# Altium integrated library Integrated_Library - 02.02.25 - 22.49.IntLib: 792 symbols (part 1 of 11) (continued)
## CMP-001-00032-8
designator C?, comment ECA-1HM471  value 470µF  Ripple Current: 650mA  Packaging: Bulk  Capacitor Type: Electrolytic  Diameter: 10mm  Case/Package: Radial  Tolerance: 20%  Max Operating Temperature: 85°C  Pins: 2  Min Operating Temperature: -40°C  RoHS Compliant: True  Mounting Technology: TH  Package Quantity: 200  Lead Pitch: 5mm  Manufacturer: Panasonic  Package Description: 2-Pin Radial Lead, Dia 10 mm, Height 22 mm  Datasheet Version: Mar-16  Package Reference: CAPPR65-500-2000X1000X2200  Voltage Rating: 50V
Aluminum Electrolytic Capacitor, 470 uF, +/- 20%, 50 V, -40 to 85 degC, 2-Pin THD, RoHS, Bulk; Ripple Current (AC): 650mA; Datasheet URL: http://industrial.panasonic.com/cdbs/www-data/pdf/RDF0000/ABA0000C1047.pdf; Manufacturer URL: http://www.panasonic.com/
footprint EEF-CX1E330R-Footprint-1
footprint CAPPR65-500-2000X1000X2200 (THD, 2-Leads, Dia 10mm, Pin Spacing 5mm)
pins: 1, 2

## CMP-001-00033-7
designator C?, comment ECA1HM4R7  value 4.7µF  Diameter: 5mm  Min Operating Temperature: -40°C  Ripple Current (AC): 45mA  Lead Pitch: 2mm  Package Quantity: 200  Capacitor Type: Electrolytic  Datasheet Version: Rev. 05, 10/2016  Case/Package: Radial  Pins: 2  RoHS Compliant: True  Package Description: 2-Pin Radial Lead, Dia 5 mm, Height 12 mm  Packaging: Bulk  Voltage Rating: 50V  Manufacturer: Panasonic  Mounting Technology: TH  Max Operating Temperature: 85°C  Package Reference: CAPPR55-200-1100X500X1200  Tolerance: 20%
Aluminum Electrolytic Capacitor, 4.7 uF, +/- 20%, 50 V, -40 to 85 degC, 2-Pin THD, RoHS, Bulk; Ripple Current: 45mA; Manufacturer URL: http://www.panasonic.com/; Datasheet URL: https://industrial.panasonic.com/cdbs/www-data/pdf/RDF0000/ABA0000C1218.pdf
footprint EEF-CX1E330R-Footprint-1
footprint CAPPR55-200-1100X500X1200 (THD, 2-Leads, Dia 5mm, Pin Spacing 2mm)
pins: 1, 2

## CMP-001-00034-7
designator C?, comment ECA-2AM101  value 100µF  Max Operating Temperature: 85°C  Package Quantity: 200  Package Description: 2-Pin Through Hole Device, Dia 10 mm, Body Length 16 mm  Package Reference: CAPPR65-500-1600X1000X1700  Pins: 2  Case/Package: Radial  Mounting Technology: TH  Packaging: Bulk  Min Operating Temperature: -40°C  Capacitor Type: Electrolytic  Datasheet Version: Mar-16  Ripple Current (AC): 350mA  RoHS Compliant: True  Manufacturer: Panasonic  Tolerance: 20%  Diameter: 10mm  Lead Pitch: 5mm  Voltage Rating: 100V
Aluminum Electrolytic Capacitor, 100 uF, +/- 20%, 100 V, -40 to 85 degC, 2-Pin THD, RoHS, Bulk; Datasheet URL: https://industrial.panasonic.com/cdbs/www-data/pdf/RDF0000/ABA0000C1047.pdf; Manufacturer URL: http://www.panasonic.com/; Ripple Current: 350mA
footprint EEF-CX1E330R-Footprint-1
footprint CAPPR65-500-1600X1000X1700 (THD, 2-Leads, Dia 10mm, Body Length 16mm)
pins: 1, 2

## CMP-001-00035-7
designator C?, comment ECA-2AM220  value 22µF  Voltage Rating: 100V  Packaging: Bulk  Package Description: 2-Pin Radial Lead, Dia 6.3 mm, Height 12.2 mm  RoHS Compliant: True  Package Quantity: 200  Case/Package: Radial  Package Reference: CAPPR55-250-1120X630X1220  Datasheet Version: Mar-16  Pins: 2  Manufacturer: Panasonic  Tolerance: 20%  Ripple Current: 115mA  Diameter: 6.3mm  Max Operating Temperature: 85°C  Capacitor Type: Electrolytic  Mounting Technology: TH  Min Operating Temperature: -40°C  Lead Pitch: 2.5mm
Aluminum Electrolytic Capacitor, 22 uF, +/- 20%, 100 V, -40 to 85 degC, 2-Pin THD, RoHS, Bulk; Manufacturer URL: http://www.panasonic.com/; Datasheet URL: https://industrial.panasonic.com/cdbs/www-data/pdf/RDF0000/ABA0000C1047.pdf; Ripple Current (AC): 115mA
footprint EEF-CX1E330R-Footprint-1
footprint CAPPR55-250-1120X630X1220 (THD, 2-Leads, Dia 6.3mm, Pin Spacing 2.5mm)
pins: 1, 2

## CMP-001-00036-7
designator C?, comment ECA-2AM470  value 47µF  Max Operating Temperature: 85°C  Pins: 2  Case/Package: Radial  Packaging: Bulk  Capacitor Type: Electrolytic  Diameter: 8mm  RoHS Compliant: True  Package Reference: CAPPR65-350-1150X800X1250  Ripple Current: 180mA  Min Operating Temperature: -40°C  Mounting Technology: TH  Manufacturer: Panasonic  Voltage Rating: 100V  Datasheet Version: Mar-16  Lead Pitch: 3.5mm  Package Quantity: 200  Package Description: 2-Pin Radial Lead, Dia 8 mm, Height 12.5 mm  Tolerance: 20%
Aluminum Electrolytic Capacitor, 47 uF, +/- 20%, 100 V, -40 to 85 degC, 2-Pin THD, RoHS, Bulk; Ripple Current (AC): 180mA; Datasheet URL: http://industrial.panasonic.com/cdbs/www-data/pdf/RDF0000/ABA0000C1047.pdf; Manufacturer URL: http://www.panasonic.com/
footprint EEF-CX1E330R-Footprint-1
footprint CAPPR65-350-1150X800X1250 (THD, 2-Leads, Dia 8mm, Pin Spacing 3.5mm)
pins: 1, 2

## CMP-001-00037-7
designator C?, comment T491D107K010AT  value 100µF  Tolerance: 10%  Packaging: TapeandReel  Datasheet Version: Jun-16  Package Quantity: 1  Max Operating Temperature: 125°C  Package Reference: T491-D  Pins: 2  Mounting Technology: SM  Min Operating Temperature: -55°C  Manufacturer: Kemet  Package Description: 2-Pin Surface Mount Device, Body 7.3 x 4.3 mm  RoHS Compliant: True  Ripple Current: 463mA  Case/Package: 2917  ESR: 700mohm  Capacitor Type: Tantalum  Voltage Rating: 10V
Tantalum Surface Mount Capacitor-Standard Tantalum, 100 uF, +/- 10%, 10 V, -55 to 125 degC, 2917 (7343 Metric), RoHS, Tape and Reel; Datasheet URL: http://www.kemet.com/Lists/ProductCatalog/Attachments/254/KEM_T2005_T491.pdf; Manufacturer URL: http://www.kemet.com/
footprint EEF-CX1E330R-Footprint-1
footprint KEMT-T491-D_M (Molded Capacitor, 2-Leads, Body 7.60x4.60mm, IPC Low Density)
footprint KEMT-T491-D_L (Molded Capacitor, 2-Leads, Body 7.60x4.60mm, IPC High Density)
footprint KEMT-T491-D_N (Molded Capacitor, 2-Leads, Body 7.60x4.60mm, IPC Medium Density)
pins: 1, 2

## CMP-001-00038-7
designator C?, comment T491D226K020AT  value 22µF  Package Reference: T491-D  Mounting Technology: SM  Min Operating Temperature: -55°C  ESR: 800mohm  Package Description: 2-Pin Surface Mount Device, Body 7.3 x 4.3 mm  Case/Package: 2917  Max Operating Temperature: 125°C  Voltage Rating: 20V  Package Quantity: 500  Ripple Current: 433mA  Resistance: 0.8Ohm  RoHS Compliant: True  Tolerance: 10%  Manufacturer: Kemet  Capacitor Type: Tantalum  Packaging: TapeandReel  Datasheet Version: Jun-16  Pins: 2
Tantalum Surface Mount Capacitor-Standard Tantalum, 22 uF, +/- 10%, 20 V, -55 to 125 degC, 2917 (7343 Metric), RoHS, Tape and Reel; Datasheet URL: http://www.kemet.com/Lists/ProductCatalog/Attachments/254/KEM_T2005_T491.pdf; Manufacturer URL: http://www.kemet.com/
footprint EEF-CX1E330R-Footprint-1
footprint KEMT-T491-D_M (Molded Capacitor, 2-Leads, Body 7.60x4.60mm, IPC Low Density)
footprint KEMT-T491-D_L (Molded Capacitor, 2-Leads, Body 7.60x4.60mm, IPC High Density)
footprint KEMT-T491-D_N (Molded Capacitor, 2-Leads, Body 7.60x4.60mm, IPC Medium Density)
pins: 1, 2

## CMP-001-00039-7
designator C?, comment T491D476K016AT  value 47µF  Min Operating Temperature: -55°C  Datasheet Version: Jun-16  ESR: 800mohm  Package Reference: T491-D  Packaging: TapeandReel  Package Quantity: 500  Mounting Technology: SM  Tolerance: 10%  Package Description: 2-Pin Surface Mount Device, Body 7.3 x 4.3 mm  Case/Package: 2917  Voltage Rating: 16V  Manufacturer: Kemet  Pins: 2  Capacitor Type: Tantalum  RoHS Compliant: True  Max Operating Temperature: 125°C
Tantalum Surface Mount Capacitor-Standard Tantalum, 47 uF, +/- 10%, 16 V, -55 to 125 degC, 2917 (7343 Metric), RoHS, Tape and Reel; Manufacturer URL: http://www.kemet.com/; Datasheet URL: http://www.kemet.com/Lists/ProductCatalog/Attachments/254/KEM_T2005_T491.pdf
footprint EEF-CX1E330R-Footprint-1
footprint KEMT-T491-D_M (Molded Capacitor, 2-Leads, Body 7.60x4.60mm, IPC Low Density)
footprint KEMT-T491-D_L (Molded Capacitor, 2-Leads, Body 7.60x4.60mm, IPC High Density)
footprint KEMT-T491-D_N (Molded Capacitor, 2-Leads, Body 7.60x4.60mm, IPC Medium Density)
pins: 1, 2

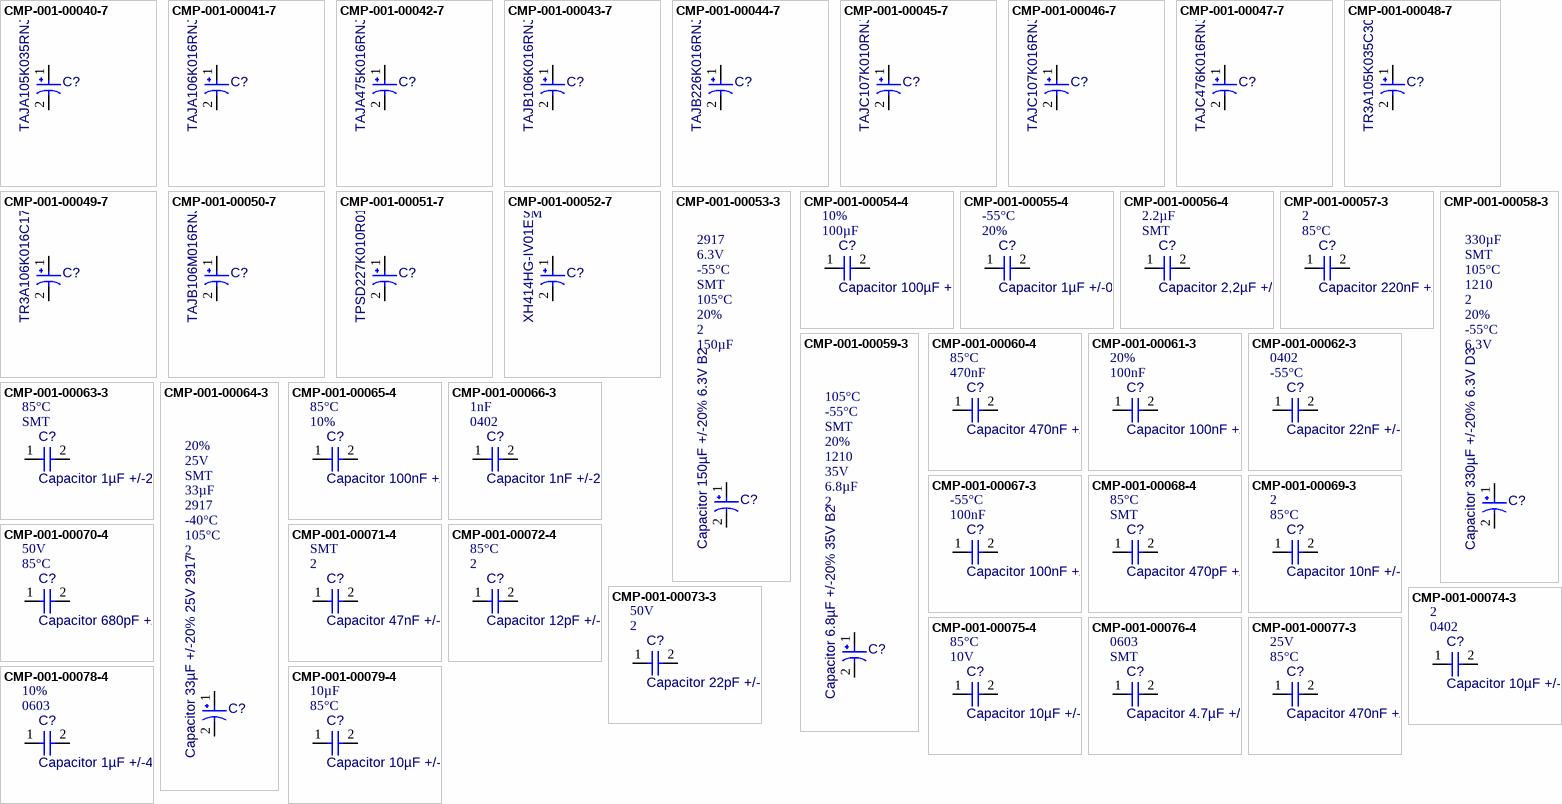
[diagram p1: symbols CMP-001-00040-7 to CMP-001-00079-4]

## CMP-001-00040-7
designator C?, comment TAJA105K035RNJ  value 1µF  Package Quantity: 2000  Case/Package: 1206  Voltage Rating: 35V  Datasheet Version: Feb-16  Tolerance: 10%  ESR: 7.5Ohm  Max Operating Temperature: 125°C  Mounting Technology: SM  Manufacturer: AVX  Package Reference: CAPMP3217X18-T  Min Operating Temperature: -55°C  Pins: 2  RoHS Compliant: True  Packaging: TapeandReel  Package Description: 2-Pin Surface Mount Device, Body 3.2 x 1.65 mm  Capacitor Type: Tantalum
Standard Tantalum, 1 uF, +/- 10%, 35 V, -55 to 125 degC, 1206 (3216 Metric), RoHS, Tape and Reel; Package URL: http://www.avx.com/download/software/literature/AVX-Footprint-Library.pdf; Manufacturer URL: http://www.avx.com/; Resistance: 7.5Ohm; Datasheet URL: http://datasheets.avx.com/TAJ.pdf
footprint EEF-CX1E330R-Footprint-1
footprint CAPMP3217X18-T_V (Molded Capacitor, 2-Leads, Body 3.40x1.8mm)
pins: 1, 2

## CMP-001-00041-7
designator C?, comment TAJA106K016RNJ  value 10µF  Pins: 2  Package Reference: CAPMP3217X18-T  RoHS Compliant: True  Case/Package: 1206  Max Operating Temperature: 125°C  Package Description: 2-Pin Surface Mount Device, Body 3.2 x 1.65 mm  Mounting Technology: SM  Voltage Rating: 16V  Tolerance: 10%  Manufacturer: AVX  Package Quantity: 1  Packaging: TapeandReel  Min Operating Temperature: -55°C  Datasheet Version: Feb-16  Capacitor Type: Tantalum  ESR: 3Ohm
Standard Tantalum, 10 uF, +/- 10%, 16 V, -55 to 125 degC, 1206 (3216 Metric), RoHS, Tape and Reel; Datasheet URL: http://datasheets.avx.com/TAJ.pdf; Package URL: http://www.avx.com/download/software/literature/AVX-Footprint-Library.pdf; Manufacturer URL: http://www.avx.com/
footprint EEF-CX1E330R-Footprint-1
footprint CAPMP3217X18-T_V (Molded Capacitor, 2-Leads, Body 3.40x1.8mm)
pins: 1, 2

## CMP-001-00042-7
designator C?, comment TAJA475K016RNJ  value 4.7µF  Pins: 2  Resistance: 4Ohm  Max Operating Temperature: 125°C  Case/Package: 1206  Package Description: 2-Pin Surface Mount Device, Body 3.2 x 1.65 mm  Min Operating Temperature: -55°C  RoHS Compliant: True  Package Reference: TAJ-A-2  Manufacturer: AVX  Capacitor Type: Tantalum  Packaging: TapeandReel  Datasheet Version: Feb-16  Tolerance: 10%  Mounting Technology: SM  Voltage Rating: 16V  Package Quantity: 2000
Standard Tantalum, 4.7 uF, +/- 10%, 16 V, -55 to 125 degC, 1206 (3216 Metric), RoHS, Tape and Reel; Manufacturer URL: http://www.avx.com/; Datasheet URL: http://datasheets.avx.com/TAJ.pdf; ESR: 4Ohm
footprint EEF-CX1E330R-Footprint-1
footprint AVX-TAJ-A-2_N (Molded Capacitor, 2-Leads, Body 3.4x1.8mm, IPC Medium Density)
footprint AVX-TAJ-A-2_M (Molded Capacitor, 2-Leads, Body 3.4x1.8mm, IPC Low Density)
footprint AVX-TAJ-A-2_L (Molded Capacitor, 2-Leads, Body 3.4x1.8mm, IPC High Density)
pins: 1, 2

## CMP-001-00043-7
designator C?, comment TAJB106K016RNJ  value 10µF  RoHS Compliant: True  Capacitor Type: Tantalum  Manufacturer: AVX  ESR: 2.8Ohm  Pins: 2  Case/Package: 1210  Package Quantity: 2000  Package Description: 2-Pin Surface Mount Device, Body 3.5 x 2.85 mm  Max Operating Temperature: 125°C  Packaging: TapeandReel  Tolerance: 10%  Mounting Technology: SM  Datasheet Version: Feb-16  Package Reference: TAJ-B-2  Voltage Rating: 16V  Min Operating Temperature: -55°C
Standard Tantalum, 10 uF, +/- 10%, 16 V, -55 to 125 degC, 1210 (3528 Metric), RoHS, Tape and Reel; Manufacturer URL: http://www.avx.com/; Datasheet URL: http://datasheets.avx.com/TAJ.pdf; Resistance: 2.8Ohm
footprint EEF-CX1E330R-Footprint-1
footprint AVX-TAJ-B-2_M (Molded Capacitor, 2-Leads, Body 3.7x3mm, IPC Low Density)
footprint AVX-TAJ-B-2_L (Molded Capacitor, 2-Leads, Body 3.7x3mm, IPC High Density)
footprint AVX-TAJ-B-2_N (Molded Capacitor, 2-Leads, Body 3.7x3mm, IPC Medium Density)
pins: 1, 2

## CMP-001-00044-7
designator C?, comment TAJB226K016RNJ  value 22µF  Package Reference: TAJ-B-2  Voltage Rating: 16V  Manufacturer: AVX  Pins: 2  Max Operating Temperature: 125°C  Mounting Technology: SM  Packaging: TapeandReel  Package Description: 2-Pin Surface Mount Device, Body 3.5 x 2.85 mm  ESR: 2.3Ohm  Datasheet Version: Feb-16  RoHS Compliant: True  Case/Package: 1210  Min Operating Temperature: -55°C  Package Quantity: 2000  Capacitor Type: Tantalum  Tolerance: 10%
Standard Tantalum, 22 uF, +/- 10%, 16 V, -55 to 125 degC, 1210 (3528 Metric), RoHS, Tape and Reel; Manufacturer URL: http://www.avx.com/; Datasheet URL: http://datasheets.avx.com/TAJ.pdf
footprint EEF-CX1E330R-Footprint-1
footprint AVX-TAJ-B-2_M (Molded Capacitor, 2-Leads, Body 3.7x3mm, IPC Low Density)
footprint AVX-TAJ-B-2_L (Molded Capacitor, 2-Leads, Body 3.7x3mm, IPC High Density)
footprint AVX-TAJ-B-2_N (Molded Capacitor, 2-Leads, Body 3.7x3mm, IPC Medium Density)
pins: 1, 2

## CMP-001-00045-7
designator C?, comment TAJC107K010RNJ  value 100µF  Pins: 2  Tolerance: 10%  Packaging: TapeandReel  Capacitor Type: Tantalum  Datasheet Version: Feb-16  Package Quantity: 500  Min Operating Temperature: -55°C  Voltage Rating: 10V  Mounting Technology: SM  Case/Package: 2412  Manufacturer: AVX  ESR: 1.2Ohm  RoHS Compliant: True  Package Description: 2-Pin Surface Mount Device, Body 6 x 3.25 mm  Max Operating Temperature: 125°C  Package Reference: TAJ-C-2
Standard Tantalum, 100 uF, +/- 10%, 10 V, -55 to 125 degC, 2312 (6032 Metric), RoHS, Tape and Reel; Datasheet URL: http://datasheets.avx.com/TAJ.pdf; Manufacturer URL: http://www.avx.com/
footprint EEF-CX1E330R-Footprint-1
footprint AVX-TAJ-C-2_M (Molded Capacitor, 2-Leads, Body 6.2x3.4mm, IPC Low Density)
footprint AVX-TAJ-C-2_N (Molded Capacitor, 2-Leads, Body 6.2x3.4mm, IPC Medium Density)
footprint AVX-TAJ-C-2_L (Molded Capacitor, 2-Leads, Body 6.2x3.4mm, IPC High Density)
pins: 1, 2

## CMP-001-00046-7
designator C?, comment TAJC107K016RNJ  value 100µF  Max Operating Temperature: 125°C  ESR: 1Ohm  Package Description: 2-Pin Surface Mount Device, Body 6 x 3.25 mm  Voltage Rating: 16V  Datasheet Version: Feb-16  Packaging: TapeandReel  RoHS Compliant: True  Case/Package: 2412  Package Quantity: 500  Package Reference: TAJ-C-2  Min Operating Temperature: -55°C  Capacitor Type: Tantalum  Tolerance: 10%  Manufacturer: AVX  Mounting Technology: SM
Standard Tantalum, 100 uF, +/- 10%, 16 V, -55 to 125 degC, 2312 (6032 Metric), RoHS, Tape and Reel; Datasheet URL: http://datasheets.avx.com/TAJ.pdf; Resistance: 1Ohm; Manufacturer URL: http://www.avx.com/
footprint EEF-CX1E330R-Footprint-1
footprint AVX-TAJ-C-2_M (Molded Capacitor, 2-Leads, Body 6.2x3.4mm, IPC Low Density)
footprint AVX-TAJ-C-2_N (Molded Capacitor, 2-Leads, Body 6.2x3.4mm, IPC Medium Density)
footprint AVX-TAJ-C-2_L (Molded Capacitor, 2-Leads, Body 6.2x3.4mm, IPC High Density)
pins: 1, 2

## CMP-001-00047-7
designator C?, comment TAJC476K016RNJ  value 47µF  RoHS Compliant: True  Max Operating Temperature: 125°C  Tolerance: 10%  Package Quantity: 500  Case/Package: 2312  Package Description: 2-Pin Surface Mount Device, Body 6 x 3.25 mm  Datasheet Version: Feb-16  Voltage Rating: 16V  Package Reference: TAJ-C-2  Pins: 2  Manufacturer: AVX  Resistance: 0.5Ohm  ESR: 500mohm  Packaging: TapeandReel  Min Operating Temperature: -55°C  Capacitor Type: Tantalum  Mounting Technology: SM
Standard Tantalum, 47 uF, +/- 10%, 16 V, -55 to 125 degC, 2312 (6032 Metric), RoHS, Tape and Reel; Manufacturer URL: http://www.avx.com/; Datasheet URL: http://datasheets.avx.com/TAJ.pdf
footprint EEF-CX1E330R-Footprint-1
footprint AVX-TAJ-C-2_M (Molded Capacitor, 2-Leads, Body 6.2x3.4mm, IPC Low Density)
footprint AVX-TAJ-C-2_N (Molded Capacitor, 2-Leads, Body 6.2x3.4mm, IPC Medium Density)
footprint AVX-TAJ-C-2_L (Molded Capacitor, 2-Leads, Body 6.2x3.4mm, IPC High Density)
pins: 1, 2

## CMP-001-00048-7
designator C?, comment TR3A105K035C3000  value 1µF  Package Reference: TR3-A  Max Operating Temperature: 125°C  RoHS Compliant: Unknown  Manufacturer: Vishay Semiconductor  Packaging: TapeandReel  Mounting Technology: SM  Voltage Rating: 35V  Capacitor Type: Tantalum  Tolerance: 10%  Package Description: 2-Pin Surface Mount Device, Body 3.2 x 1.6 mm  Datasheet Version: Aug-16  Min Operating Temperature: -55°C
Solid Tantalum Surface Mount Chip Capacitor, TANTAMOUNT(TM), Molded Case, Low ESR, 1 uF, +/- 10%, 35 V, -55 to 125 degC, 1206 (3216 Metric), RoHS, Tape and Reel; Case/Package: TR3-A; Manufacturer URL: http://www.vishay.com/; Datasheet URL: http://www.vishay.com/docs/40080/tr3.pdf
footprint EEF-CX1E330R-Footprint-1
footprint VISH-TR3-A_V (Molded Capacitor, 2-Leads, Body 3.40x1.80mm)
pins: 1, 2

## CMP-001-00049-7
designator C?, comment TR3A106K016C1700  value 10µF  Mounting Technology: SM  Case/Package: TR3-A  Datasheet Version: Aug-16  Voltage Rating: 16V  RoHS Compliant: Unknown  Min Operating Temperature: -55°C  Tolerance: 10%  Max Operating Temperature: 125°C  Capacitor Type: Tantalum  Packaging: TapeandReel  Manufacturer: Vishay Semiconductor  Package Description: 2-Pin Surface Mount Device, Body 3.2 x 1.6 mm
Solid Tantalum Surface Mount Chip Capacitor, TANTAMOUNT(TM), Molded Case, Low ESR, 10 uF, +/- 10%, 16 V, -55 to 125 degC, 1206 (3216 Metric), RoHS, Tape and Reel; Datasheet URL: http://www.vishay.com/docs/40080/tr3.pdf; Manufacturer URL: http://www.vishay.com/; Package Reference: TR3-A
footprint EEF-CX1E330R-Footprint-1
footprint VISH-TR3-A_V (Molded Capacitor, 2-Leads, Body 3.40x1.80mm)
pins: 1, 2

## CMP-001-00050-7
designator C?, comment TAJB106M016RNJ  value 10µF  Pins: 2  Voltage Rating: 16V  Min Operating Temperature: -55°C  Package Description: 2-Pin Surface Mount Device, Body 3.5 x 2.85 mm  Package Quantity: 1  Tolerance: 20%  Package Reference: 3528-21  Packaging: TapeandReel  Manufacturer: AVX Corporation  Datasheet Version: 42736  Mounting Technology: SM  Capacitor Type: Tantalum  Case/Package: 1210  Max Operating Temperature: 125°C  RoHS Compliant: True
Tantalum Capacitor, 10 uF, +/- 20%, 16 V, -55 to 125 degC, 1411 (3528 Metric), RoHS, Tape and Reel; Manufacturer URL: http://www.avx.com/; Datasheet URL: http://datasheets.avx.com/TAJ.pdf
footprint EEF-CX1E330R-Footprint-1
footprint CAPMP3529X21-T_V (Molded Capacitor, 2-Leads, Body 3.70x3mm)
pins: 1, 2

## CMP-001-00051-7
designator C?, comment TPSD227K010R0150  value 220µF  Case/Package: 2917  Package Description: 2-Pin Surface Mount Device, Body 7.3 x 4.35 mm  Tolerance: 10%  RoHS Compliant: True  Capacitor Type: Tantalum  Voltage Rating: 10V  Pins: 2  Package Quantity: 1  Max Operating Temperature: 125°C  Mounting Technology: SM  Packaging: TapeandReel  Datasheet Version: 42736  Package Reference: 7343-31  Min Operating Temperature: -55°C  Manufacturer: AVX Corporation
Tantalum Capacitor, 220 uF, +/- 10%, 10 V, -55 to 125 degC, 2917 (7343 Metric), RoHS, Tape and Reel; Datasheet URL: https://datasheet.ciiva.com/8080/1680477-8080379.pdf; Manufacturer URL: http://www.avx.com/
footprint EEF-CX1E330R-Footprint-1
footprint CAPMP7344X31-T_V (Molded Capacitor, 2-Leads, Body 7.50x4.5mm)
pins: 1, 2

## CMP-001-00052-7
designator C?, comment XH414HG-IV01E  value 80mF  Mounting Technology: SM  Pins: 2  Package Description: 2-Pin Surface Mount Device, Diameter 4.8 mm  RoHS Compliant: True  Voltage Rating: 3.3V  Datasheet Version: 39814  Manufacturer: Seiko Instruments  Capacitor Type: Electrolytic  Max Operating Temperature: 60°C  Min Operating Temperature: -20°C
Electric Double Layer Capacitor, 80 mF, 3.3 V, -20 to 60 degC, RoHS; Package Reference: XH414HG-IV01E; Case/Package: XH414HG-IV01E; Manufacturer URL: http://www.sii.co.jp/en/; Datasheet URL: http://media.digikey.com/pdf/Data%20Sheets/Seiko%20Instruments%20PDFs/XH414HG,%20XH409HG.pdf
footprint EEF-CX1E330R-Footprint-1
footprint SEIK-XH414HG-IV01E_V (SMD, 2-Leads, Diameter 4.8mm)
pins: 1, 2

## CMP-001-00053-3
designator C?, comment Capacitor 150µF +/-20% 6.3V B2  value 150µF  Pins: 2  Tolerance: 20%  Max Operating Temperature: 105°C  Mounting Technology: SMT  Min Operating Temperature: -55°C  Voltage Rating: 6.3V  Case/Package: 2917
Molded Tantalum Polymer Capacitor, 150 uF, +/- 20%, 6.3 V, -55 to 105 degC, 2-Pin SMD, RoHS, Tape and Reel
footprint EEF-CX1E330R-Footprint-1
footprint PNSC-6TPE150MAZB_L (Molded Capacitor, 2-Leads, Body 3.70x3mm, IPC High Density)
pins: 1, 2

## CMP-001-00054-4
designator C?, comment Capacitor 100µF +/-20% 6.3V 0805  value 100µF  Tolerance: 10%  Min Operating Temperature: -55°C  Max Operating Temperature: 85°C  Pins: 2  Mounting Technology: SMT  Case/Package: 0805  Voltage Rating: 6.3V
Chip Capacitor, 100µF +/-20%, 6.3V, 0805, Thickness 1.45 mm
footprint CAPC0603(1608)100_L (Chip Capacitor, Body 1.6x0.8mm, Height 1.0mm, IPC High Density)
footprint CAPC0805(2012)145_L (Chip Capacitor, Body 2.0x1.2mm, Height 1.45mm, IPC High Density)
pins: 1, 2

## CMP-001-00055-4
designator C?, comment Capacitor 1µF +/-0.1% 25V 0603  value 1µF  Tolerance: 20%  Min Operating Temperature: -55°C  Max Operating Temperature: 85°C  Voltage Rating: 25V  Mounting Technology: SMT  Case/Package: 0603  Pins: 2
Chip Capacitor, 1µF +/-0.1%, 25V, 0603, Thickness 1 mm
footprint CAPC0603(1608)100_L (Chip Capacitor, Body 1.6x0.8mm, Height 1.0mm, IPC High Density)
footprint CAPC0603(1608)100_L (Chip Capacitor, Body 1.6x0.8mm, Height 1.0mm, IPC High Density)
pins: 1, 2

## CMP-001-00056-4
designator C?, comment Capacitor 2,2µF +/-20% 10V 0402  value 2.2µF  Mounting Technology: SMT  Max Operating Temperature: 85°C  Case/Package: 0402  Pins: 2  Min Operating Temperature: -55°C  Voltage Rating: 10V  Tolerance: 10%
Chip Capacitor, 2,2µF +/-20%, 10V, 0402, Thickness 0.6 mm
footprint CAPC0603(1608)100_L (Chip Capacitor, Body 1.6x0.8mm, Height 1.0mm, IPC High Density)
footprint CAPC0402(1005)60_L (Chip Capacitor, Body 1.0x0.5mm, Height 0.6mm, IPC High Density)
pins: 1, 2

## CMP-001-00057-3
designator C?, comment Capacitor 220nF +/-20% 10V 0402  value 220nF  Max Operating Temperature: 85°C  Pins: 2  Tolerance: 10%  Case/Package: 0402  Mounting Technology: SMT  Voltage Rating: 10V  Min Operating Temperature: -55°C
Chip Capacitor, 220nF +/-20%, 10V, 0402, Thickness 0.6 mm
footprint CAPC0603(1608)100_L (Chip Capacitor, Body 1.6x0.8mm, Height 1.0mm, IPC High Density)
footprint CAPC0402(1005)60_L (Chip Capacitor, Body 1.0x0.5mm, Height 0.6mm, IPC High Density)
pins: 1, 2

## CMP-001-00058-3
designator C?, comment Capacitor 330µF +/-20% 6.3V D3  value 330µF  Voltage Rating: 6.3V  Min Operating Temperature: -55°C  Tolerance: 20%  Pins: 2  Case/Package: 1210  Max Operating Temperature: 105°C  Mounting Technology: SMT
Molded Tantalum Polymer Capacitor, 330 uF, +/- 20%, 6.3 V, -55 to 105 degC, 2-Pin SMD, RoHS, Tape and Reel
footprint EEF-CX1E330R-Footprint-1
footprint PNSC-6TPF220M5L (Molded Capacitor, 2-Leads, Body 7.60x4.60mm, IPC High Density)
pins: 1, 2

## CMP-001-00059-3
designator C?, comment Capacitor 6.8µF +/-20% 35V B2  value 6.8µF  Pins: 2  Voltage Rating: 35V  Case/Package: 1210  Tolerance: 20%  Mounting Technology: SMT  Min Operating Temperature: -55°C  Max Operating Temperature: 105°C
Molded Tantalum Polymer Capacitor, 6.8 uF, +/- 20%, 35 V, -55 to 105 degC, 2-Pin SMD, RoHS, Tape and Reel
footprint EEF-CX1E330R-Footprint-1
footprint PNSC-6TPE150MAZB_L (Molded Capacitor, 2-Leads, Body 3.70x3mm, IPC High Density)
pins: 1, 2

## CMP-001-00060-4
designator C?, comment Capacitor 470nF +/-40% 10V 0402  value 470nF  Max Operating Temperature: 85°C  Tolerance: 20%  Case/Package: 0402  Voltage Rating: 10V  Min Operating Temperature: -55°C  Mounting Technology: SMT  Pins: 2
Chip Capacitor, 470nF +/-40%, 10V, 0402, Thickness 0.6 mm
footprint CAPC0603(1608)100_L (Chip Capacitor, Body 1.6x0.8mm, Height 1.0mm, IPC High Density)
footprint CAPC0402(1005)60_L (Chip Capacitor, Body 1.0x0.5mm, Height 0.6mm, IPC High Density)
pins: 1, 2

## CMP-001-00061-3
designator C?, comment Capacitor 100nF +/-20% 10V 0402  value 100nF  Tolerance: 20%  Mounting Technology: SMT  Voltage Rating: 10V  Max Operating Temperature: 85°C  Pins: 2  Case/Package: 0402  Min Operating Temperature: -55°C
Chip Capacitor, 100nF +/-20%, 10V, 0402, Thickness 0.6 mm
footprint CAPC0603(1608)100_L (Chip Capacitor, Body 1.6x0.8mm, Height 1.0mm, IPC High Density)
footprint CAPC0402(1005)60_L (Chip Capacitor, Body 1.0x0.5mm, Height 0.6mm, IPC High Density)
pins: 1, 2

## CMP-001-00062-3
designator C?, comment Capacitor 22nF +/-20% 10V 0402  value 22nF  Min Operating Temperature: -55°C  Case/Package: 0402  Pins: 2  Max Operating Temperature: 85°C  Mounting Technology: SMT  Tolerance: 10%  Voltage Rating: 10V
Chip Capacitor, 22nF +/-20%, 10V, 0402, Thickness 0.6 mm
footprint CAPC0603(1608)100_L (Chip Capacitor, Body 1.6x0.8mm, Height 1.0mm, IPC High Density)
footprint CAPC0402(1005)60_L (Chip Capacitor, Body 1.0x0.5mm, Height 0.6mm, IPC High Density)
pins: 1, 2

## CMP-001-00063-3
designator C?, comment Capacitor 1µF +/-20% 10V 0402  value 1µF  Mounting Technology: SMT  Max Operating Temperature: 85°C  Voltage Rating: 10V  Pins: 2  Case/Package: 0402  Tolerance: 10%  Min Operating Temperature: -55°C
Chip Capacitor, 1µF +/-20%, 10V, 0402, Thickness 0.6 mm
footprint CAPC0603(1608)100_L (Chip Capacitor, Body 1.6x0.8mm, Height 1.0mm, IPC High Density)
footprint CAPC0402(1005)60_L (Chip Capacitor, Body 1.0x0.5mm, Height 0.6mm, IPC High Density)
pins: 1, 2

## CMP-001-00064-3
designator C?, comment Capacitor 33µF +/-20% 25V 2917  value 33µF  Pins: 2  Max Operating Temperature: 105°C  Min Operating Temperature: -40°C  Case/Package: 2917  Mounting Technology: SMT  Voltage Rating: 25V  Tolerance: 20%
Aluminum Organic Polymer Capacitors 33uF 25volt SP-Cap AEC-Q200
footprint EEF-CX1E330R-Footprint-1
footprint EEF-CX1E330R-Footprint-1
pins: 1, 2

## CMP-001-00065-4
designator C?, comment Capacitor 100nF +/-20% 25V 0402  value 100nF  Tolerance: 10%  Max Operating Temperature: 85°C  Min Operating Temperature: -55°C  Pins: 2  Voltage Rating: 25V  Mounting Technology: SMT  Case/Package: 0402
Chip Capacitor, 100nF +/-20%, 25V, 0402, Thickness 0.6 mm
footprint CAPC0603(1608)100_L (Chip Capacitor, Body 1.6x0.8mm, Height 1.0mm, IPC High Density)
footprint CAPC0402(1005)60_L (Chip Capacitor, Body 1.0x0.5mm, Height 0.6mm, IPC High Density)
pins: 1, 2

## CMP-001-00066-3
designator C?, comment Capacitor 1nF +/-20% 50V 0402  value 1nF  Case/Package: 0402  Pins: 2  Min Operating Temperature: -55°C  Max Operating Temperature: 85°C  Tolerance: 10%  Voltage Rating: 50V  Mounting Technology: SMT
Chip Capacitor, 1nF +/-20%, 50V, 0402, Thickness 0.33 mm
footprint CAPC0603(1608)100_L (Chip Capacitor, Body 1.6x0.8mm, Height 1.0mm, IPC High Density)
footprint CAPC0402(1005)33_L (Chip Capacitor, Body 1.0x0.5mm, Height 0.33mm, IPC High Density)
pins: 1, 2

## CMP-001-00067-3
designator C?, comment Capacitor 100nF +/-20% 50V 0402  value 100nF  Min Operating Temperature: -55°C  Pins: 2  Case/Package: 0402  Max Operating Temperature: 85°C  Voltage Rating: 50V  Mounting Technology: SMT  Tolerance: 10%
Chip Capacitor, 100nF +/-20%, 50V, 0402, Thickness 0.6 mm
footprint CAPC0603(1608)100_L (Chip Capacitor, Body 1.6x0.8mm, Height 1.0mm, IPC High Density)
footprint CAPC0402(1005)60_L (Chip Capacitor, Body 1.0x0.5mm, Height 0.6mm, IPC High Density)
pins: 1, 2

## CMP-001-00068-4
designator C?, comment Capacitor 470pF +/-20% 50V 0402  value 470pF  Mounting Technology: SMT  Max Operating Temperature: 85°C  Min Operating Temperature: -55°C  Tolerance: 20%  Pins: 2  Voltage Rating: 50V  Case/Package: 0402
Chip Capacitor, 470pF +/-20%, 50V, 0402, Thickness 0.6 mm
footprint CAPC0603(1608)100_L (Chip Capacitor, Body 1.6x0.8mm, Height 1.0mm, IPC High Density)
footprint CAPC0402(1005)60_L (Chip Capacitor, Body 1.0x0.5mm, Height 0.6mm, IPC High Density)
pins: 1, 2

## CMP-001-00069-3
designator C?, comment Capacitor 10nF +/-20% 50V 0402  value 10nF  Max Operating Temperature: 85°C  Pins: 2  Case/Package: 0402  Voltage Rating: 50V  Min Operating Temperature: -55°C  Mounting Technology: SMT  Tolerance: 5%
Chip Capacitor, 10nF +/-20%, 50V, 0402, Thickness 0.6 mm
footprint CAPC0603(1608)100_L (Chip Capacitor, Body 1.6x0.8mm, Height 1.0mm, IPC High Density)
footprint CAPC0402(1005)60_L (Chip Capacitor, Body 1.0x0.5mm, Height 0.6mm, IPC High Density)
pins: 1, 2